# Altium footprint library TarabusLibrary.PcbLib: 591 footprints (part 15 of 37)
Each footprint in its own frame and in the unit in brackets; x right, y up, seen from the top. Pads: shape width x height; smd on the part's side, far side on the other; paste and mask are expansions set on the pad; w line width, h text height; cw(c..) or ccw(c..) is an arc to the next point about the centre after c.
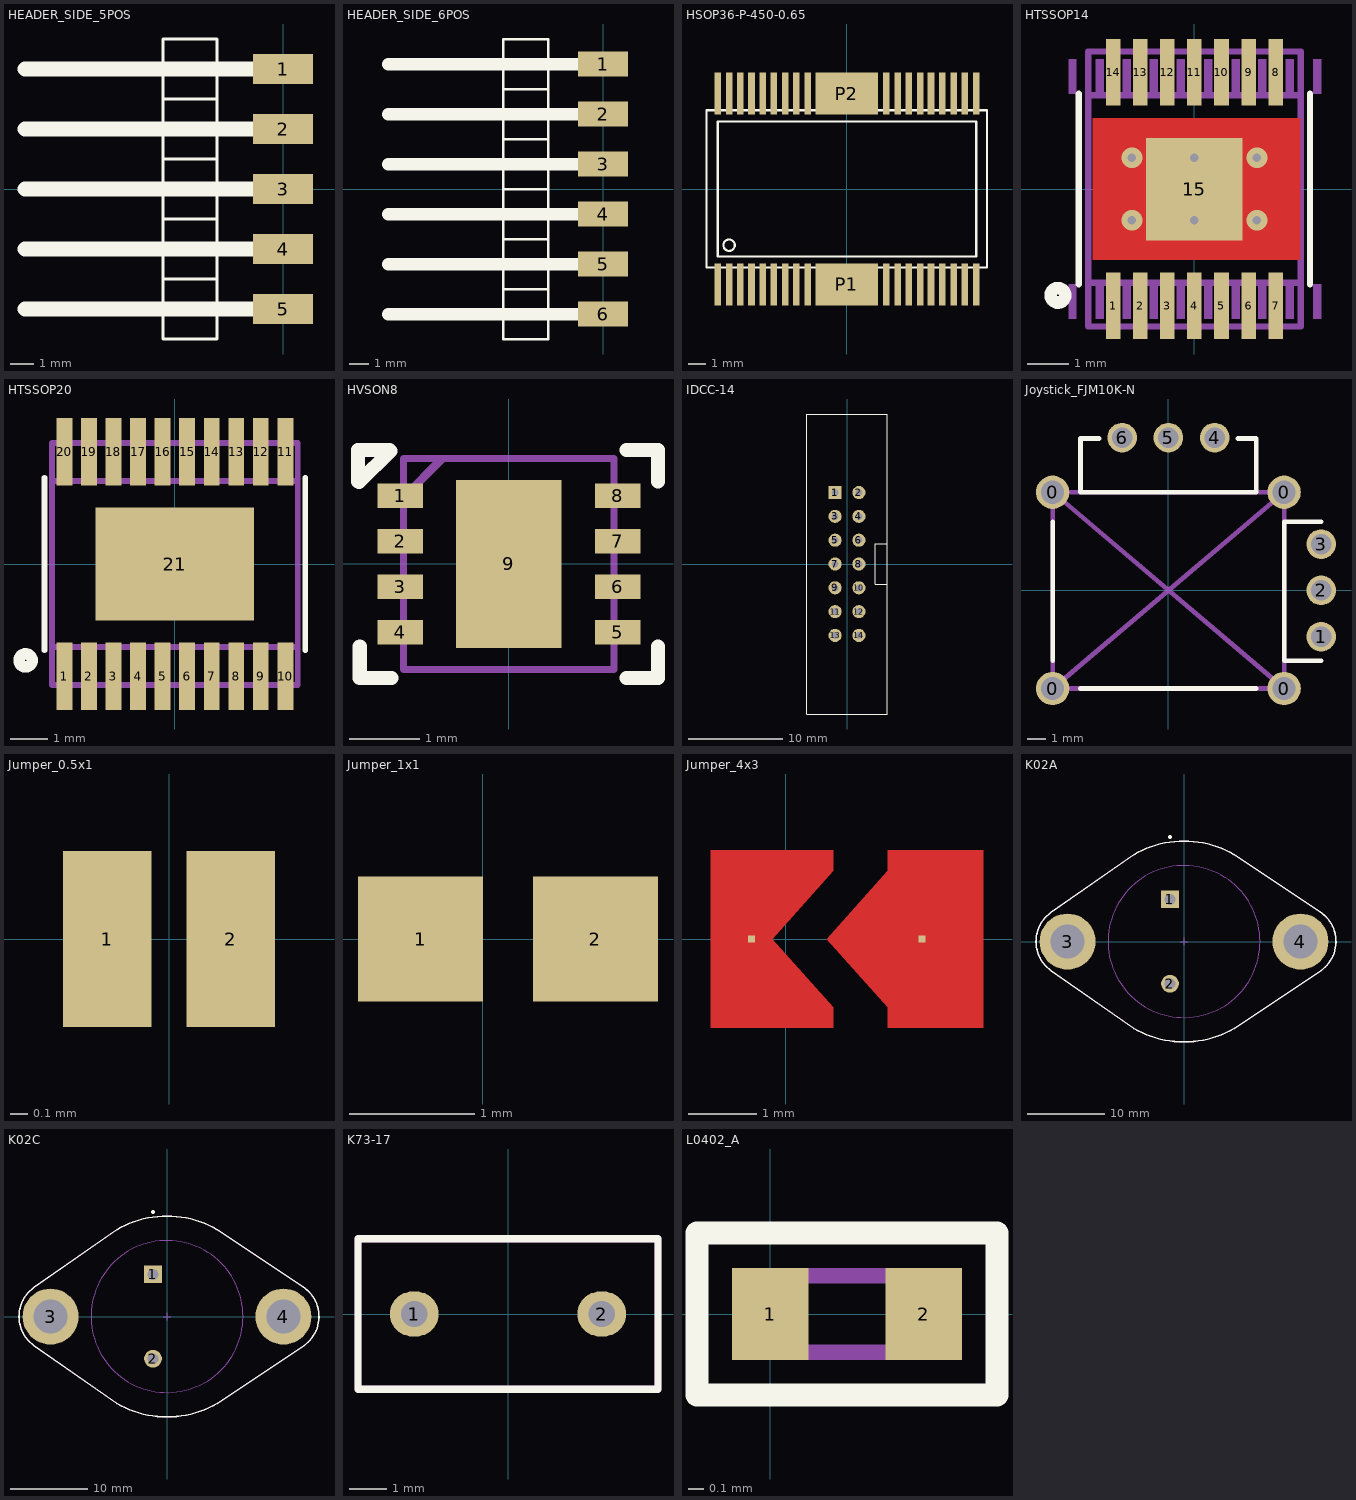
[diagram p14: the footprints below, top view; thin cyan lines are the x and y axes]

## HEADER_SIDE_5POS [mm]
pads (5):
  rect 2.54x1.27 smd: 1(0,5.08) 2(0,2.54) 3(0,0) 4(0,-2.54) 5(0,-5.08)
Top Overlay:
  lines w0.127: -2.794,-3.81 -5.08,-3.81 ; -2.794,-1.27 -5.08,-1.27 ; -5.08,-3.81 -5.08,-6.35 -2.794,-6.35 -2.794,1.27 ; -5.08,-3.81 -5.08,-1.27 ; -5.08,-1.27 -5.08,1.27 ; -5.08,1.27 -2.794,1.27 ; -5.08,1.27 -5.08,3.81 ; -5.08,3.81 -2.794,3.81 ; -5.08,3.81 -5.08,6.35 -2.794,6.35 -2.794,3.81 ; -2.794,1.27 -2.794,3.81
  lines w0.635: -10.922,-5.08 -0.508,-5.08 ; -10.922,-2.54 -0.508,-2.54 ; -10.922,0 -0.508,0 ; -10.922,2.54 -0.508,2.54 ; -10.922,5.08 -0.508,5.08

## HEADER_SIDE_6POS [mm]
pads (6):
  rect 2.54x1.27 smd: 1(0,6.35) 2(0,3.81) 3(0,1.27) 4(0,-1.27) 5(0,-3.81) 6(0,-6.35)
Top Overlay:
  lines w0.127: -5.08,-5.08 -5.08,-2.54 ; -5.08,-5.08 -5.08,-7.62 -2.794,-7.62 -2.794,-5.08 ; -5.08,-5.08 -2.794,-5.08 ; -5.08,-2.54 -5.08,0 ; -5.08,-2.54 -2.794,-2.54 ; -5.08,0 -5.08,2.54 ; -5.08,0 -2.794,0 ; -5.08,0 -2.794,0 ; -5.08,2.54 -5.08,5.08 ; -5.08,2.54 -2.794,2.54 ; -5.08,5.08 -5.08,7.62 -2.794,7.62 -2.794,5.08 ; -5.08,5.08 -2.794,5.08 ; -2.794,-5.08 -2.794,-2.54 ; -2.794,-2.54 -2.794,0 ; -2.794,0 -2.794,2.54 ; -2.794,2.54 -2.794,5.08
  lines w0.635: -10.922,-6.35 -0.508,-6.35 ; -10.922,-3.81 -0.508,-3.81 ; -10.922,-1.27 -0.508,-1.27 ; -10.922,1.27 -0.508,1.27 ; -10.922,3.81 -0.508,3.81 ; -10.922,6.35 -0.508,6.35

## HSOP36-P-450-0.65 [mil]
pads (38):
  rect 15x95 smd: 1(-294.29,-217.52) 2(-268.7,-217.52) 3(-243.11,-217.52) 4(-217.52,-217.52) 5(-191.93,-217.52) 6(-166.34,-217.52) 7(-140.75,-217.52) 8(-115.16,-217.52) 9(-89.57,-217.52) 10(90,-217.52) 11(116,-217.52) 12(141,-217.52) 13(167,-217.52) 14(192,-217.52) 15(218,-217.52) 16(244,-217.52) 17(269,-217.52) 18(295,-217.52) 19(295,218) 20(269,218) 21(244,218) 22(218,218) 23(192,218) 24(167,218) 25(141,218) 26(116,218) 27(90,218) 28(-89.57,218) 29(-115.16,218) 30(-140.75,218) 31(-166.34,218) 32(-191.93,218) 33(-217.52,218) 34(-243.11,218) 35(-268.7,218) 36(-294.29,218)
  rect 142x95 smd: P1(0,-217.52) P2(0,218)
Top Overlay:
  circle w5: c-268.7,-127.95 r13
  lines w5: -319.88,-179.13 320,-179.13 320,180 -319.88,180 -319.88,-179.13 ; -294.29,-153.54 295,-153.54 295,154 -294.29,154 -294.29,-153.54

## HTSSOP14 [mm]
height 1.1
pads (15):
  rect 0.35x1.6 smd mask+0.075: 1(-1.95,-2.8) 2(-1.3,-2.8) 3(-0.65,-2.8) 4(0,-2.8) 5(0.65,-2.8) 6(1.3,-2.8) 7(1.95,-2.8) 8(1.95,2.8) 9(1.3,2.8) 10(0.65,2.8) 11(0,2.8) 12(-0.65,2.8) 13(-1.3,2.8) 14(-1.95,2.8)
  rect 2.31x2.46 smd mask+0.075: 15(0,-0.002)
via 0,0.75 diameter 0.5 hole 0.2
via 0,-0.75 diameter 0.5 hole 0.2
via 1.5,-0.75 diameter 0.5 hole 0.2
via 1.5,0.75 diameter 0.5 hole 0.2
via -1.5,-0.75 diameter 0.5 hole 0.2
via -1.5,0.75 diameter 0.5 hole 0.2
Top Layer:
  rectangle: -2.45,-1.7 2.55,1.7
Top Overlay:
  circle w0.3: c-3.275,-2.552 r0.175
  lines w0.152: -2.775,-2.284 -2.775,2.284 ; 2.775,-2.284 2.775,2.284
Mechanical 7:
  lines w0.152: -2.55,-2.25 2.55,-2.25 ; -2.55,2.25 2.55,2.25 ; -2.55,-3.3 -2.55,3.3 2.55,3.3 2.55,-3.3 -2.55,-3.3
Mechanical 10:
  text ".Comment" at -1.7,4.45 h1.52
  text ".Designator" at -1.85,-5.225 h1.52
Mechanical 16:
  rectangle: -3.027,2.284 -2.823,3.123
  rectangle: -2.377,2.284 -2.173,3.123
  rectangle: -1.727,2.284 -1.523,3.123
  rectangle: -1.077,2.284 -0.873,3.123
  rectangle: -0.427,2.284 -0.223,3.123
  rectangle: 0.229,2.284 0.432,3.123
  rectangle: 0.889,2.284 1.092,3.123
  rectangle: 1.524,2.284 1.727,3.123
  rectangle: 2.184,2.284 2.388,3.123
  rectangle: 2.845,2.284 3.048,3.123
  rectangle: 2.845,-3.123 3.048,-2.284
  rectangle: 2.184,-3.123 2.388,-2.284
  rectangle: 1.524,-3.123 1.727,-2.284
  rectangle: 0.889,-3.123 1.092,-2.284
  rectangle: 0.229,-3.123 0.432,-2.284
  rectangle: -0.427,-3.123 -0.223,-2.284
  rectangle: -1.077,-3.123 -0.873,-2.284
  rectangle: -1.727,-3.123 -1.523,-2.284
  rectangle: -2.377,-3.123 -2.173,-2.284
  rectangle: -3.027,-3.123 -2.823,-2.284
3D body: height 1.1, standoff 0.05, extent -2.55,-2.25 2.55,2.25
3D body: height 0.5, standoff 0.05, extent -2.55,2.2 2.55,3.3
3D body: height 0.5, standoff 0.05, extent -2.55,-3.3 2.55,-2.2

## HTSSOP20 [mm]
height 1.1
pads (21):
  rect 0.42x1.78 smd mask+0.075: 1(-2.925,-2.97) 2(-2.275,-2.97) 3(-1.625,-2.97) 4(-0.975,-2.97) 5(-0.325,-2.97) 6(0.325,-2.97) 7(0.975,-2.97) 8(1.625,-2.97) 9(2.275,-2.97) 10(2.925,-2.97) 11(2.925,2.97) 12(2.275,2.97) 13(1.625,2.97) 14(0.975,2.97) 15(0.325,2.97) 16(-0.325,2.97) 17(-0.975,2.97) 18(-1.625,2.97) 19(-2.275,2.97) 20(-2.925,2.97)
  rect 4.2x3 smd mask+0.075: 21(0,-0.002)
Top Overlay:
  circle w0.3: c-3.95,-2.552 r0.175
  lines w0.152: -3.45,-2.284 -3.45,2.284 ; 3.45,-2.284 3.45,2.284
Mechanical 7:
  lines w0.152: -3.25,-2.2 3.25,-2.2 ; -3.25,2.2 3.25,2.2 ; -3.25,-3.2 3.25,-3.2 3.25,3.2 -3.25,3.2 -3.25,-3.2
Mechanical 10:
  text ".Designator" at -1.85,-5.225 h1.52
  text ".Comment" at -1.7,4.45 h1.52
Mechanical 16:
  rectangle: -3.027,-3.123 -2.823,-2.284
  rectangle: -2.377,-3.123 -2.173,-2.284
  rectangle: -1.727,-3.123 -1.523,-2.284
  rectangle: -1.077,-3.123 -0.873,-2.284
  rectangle: -0.427,-3.123 -0.223,-2.284
  rectangle: 0.229,-3.123 0.432,-2.284
  rectangle: 0.889,-3.123 1.092,-2.284
  rectangle: 1.524,-3.123 1.727,-2.284
  rectangle: 2.184,-3.123 2.388,-2.284
  rectangle: 2.845,-3.123 3.048,-2.284
  rectangle: 2.845,2.284 3.048,3.123
  rectangle: 2.184,2.284 2.388,3.123
  rectangle: 1.524,2.284 1.727,3.123
  rectangle: 0.889,2.284 1.092,3.123
  rectangle: 0.229,2.284 0.432,3.123
  rectangle: -0.427,2.284 -0.223,3.123
  rectangle: -1.077,2.284 -0.873,3.123
  rectangle: -1.727,2.284 -1.523,3.123
  rectangle: -2.377,2.284 -2.173,3.123
  rectangle: -3.027,2.284 -2.823,3.123
3D body: height 0.5, standoff 0.05, extent -3.25,-3.2 3.25,-2.2
3D body: height 0.5, standoff 0.05, extent -3.25,2.2 3.25,3.2
3D body: height 1.1, standoff 0.05, extent -3.25,-2.2 3.25,2.2

## HVSON8 [mm] "PSON, 8-Leads, Body 4x4mm, Pitch 0.8mm, NSC Recommended"
height 0.8
pads (9):
  rect 0.65x0.35 smd mask+0.051: 1(-1.55,0.975) 2(-1.55,0.325) 3(-1.55,-0.325) 4(-1.55,-0.975) 5(1.55,-0.975) 6(1.55,-0.325) 7(1.55,0.325) 8(1.55,0.975)
  rect 1.5x2.4 smd mask+0.051: 9(0,0)
Top Overlay:
  lines w0.2: -2.15,1.175 -2.15,1.625 -1.7,1.625 ; -2.134,1.166 -1.688,1.612 ; -2.125,-1.175 -2.125,-1.625 -1.675,-1.625 ; 1.675,-1.625 2.125,-1.625 2.125,-1.175 ; 1.675,1.625 2.125,1.625 2.125,1.175
Mechanical 7:
  lines w0.05: -1.5,0.9 -0.9,1.5 ; -1.475,0.975 -0.975,1.475 -1.025,1.475 -1.475,1.025 ; -1.5,-1.5 -1.5,1.5 1.5,1.5 1.5,-1.5 -1.5,-1.5
  lines w0.1: -0.5,0 0.5,0 ; 0,-0.5 0,0.5
Mechanical 9:
  lines w0.1: -1.5,-1.5 -1.5,1.5 1.5,1.5 1.5,-1.5 -1.5,-1.5
Mechanical 10:
  text ".Designator" at -1.175,-2 h0.6
  text ".Comment" at -1.025,1.775 h0.6
3D body: height 0.8, standoff 0, extent -1.5,-1.5 1.5,1.5

## IDCC-14 [mm]
pads (14):
  rect 1.4x1.4 hole 0.75: 1(-1.27,7.62)
  round 1.4 hole 0.75: 2(1.27,7.62) 3(-1.27,5.08) 4(1.27,5.08) 5(-1.27,2.54) 6(1.27,2.54) 7(-1.27,0) 8(1.27,0) 9(-1.27,-2.54) 10(1.27,-2.54) 11(-1.27,-5.08) 12(1.27,-5.08) 13(-1.27,-7.62) 14(1.27,-7.62)
Top Overlay:
  lines w0.1: 4.27,-2.15 3,-2.15 3,2.15 4.27,2.15 ; -4.27,-16 -4.27,16 4.27,16 4.27,-16 -4.27,-16
3D body: height 28, standoff 0, extent -4.27,10 4.27,16
3D body: height 28, standoff 0, extent -4.27,-16 4.27,-10
3D body: height 12, standoff 0, extent -4.27,-10 4.27,10

## Joystick_FJM10K-N [mm]
pads (10):
  round 1.8 hole 1.25: 0(-6.25,-5.311) 0(-6.25,5.289) 0(6.25,-5.311) 0(6.25,5.289)
  round 1.6 hole 1.1: 1(8.25,-2.511) 2(8.25,-0.011) 3(8.25,2.489) 4(2.5,8.239) 5(0,8.239) 6(-2.5,8.239)
Top Overlay:
  lines w0.254: -6.25,-3.811 -6.25,3.689 ; -4.75,-5.311 4.75,-5.311 ; -3.75,8.189 -4.75,8.189 -4.75,5.289 4.75,5.289 4.75,8.189 3.75,8.189 ; 8.25,-3.811 6.25,-3.811 6.25,3.689 8.25,3.689
Mechanical 7:
  lines w0.254: -6.225,5.289 6.25,-5.311 ; -6.25,-5.311 6.25,5.289 ; -6.25,-5.311 -6.25,5.289 6.25,5.289 ; -6.25,-5.311 6.25,-5.311 ; 6.25,-5.311 6.25,5.289
3D body "Основание джостика.STEP": height 18, standoff -3.7, extent -6.775,-6.536 10.275,10.264

## Jumper_0.5x1 [mm]
pads (2):
  rect 0.5x1 smd mask+0.1: 1(-0.35,0) 2(0.35,0)

## Jumper_1x1 [mm] "1x1"
pads (2):
  rect 1x1 smd mask+0.2: 1(-0.5,0) 2(0.9,0)

## Jumper_4x3 [mm] "4x3"
pads (2):
  rect 0.1x0.1 smd: 1(-0.5,0) 2(2,0)
Top Layer:
  region: 1.5,1.3 1.5,1 0.6,0 1.5,-1 1.5,-1.3 2.9,-1.3 2.9,1.3
  region: -1.1,1.3 -1.1,-1.3 0.7,-1.3 0.7,-1 -0.2,0 0.7,1 0.7,1.3
Top Solder:
  region: -1.3,1.5 -1.3,-1.5 3.1,-1.5 3.1,1.5

## K02A [mm] "Oval Flange Mount with (2) Offset Leads; Pin Spacing 10.93 mm; Lead Dia. 1.09 mm (max)"
height 8.94
pads (4):
  rect 2.3x2.3 hole 1.4: 1(-1.815,5.46)
  round 2.3 hole 1.4: 2(-1.815,-5.46)
  round 7.25 hole 4.4: 3(-15.075,0) 4(15.075,0)
Top Overlay:
  circle w0.25: c-1.815,13.53 r0.125
  lines w0.2: -17.2,-3.767 cw(c-14.561,0.001) -17.2,3.769 -6.5,11.258 cw(c0,0) 6.5,11.258 17.58,3.858 cw(c15.075,0) 17.713,-3.768 6.5,-11.258 cw(c0,0) -6.5,-11.258 -17.2,-3.767
Mechanical 13:
  circle w0.1: c0,0 r9.84
  lines w0.1: -17.2,-3.767 cw(c-14.561,0.001) -17.2,3.769 -6.5,11.258 cw(c0,0) 6.5,11.258 17.58,3.858 cw(c15.075,0) 17.713,-3.768 6.5,-11.258 cw(c0,0) -6.5,-11.258 -17.2,-3.767
Mechanical 15:
  lines w0.1: -0.5,0 0.5,0 ; 0,-0.5 0,0.5
3D body: height 1.77, standoff 0, extent -19.162,-13.001 19.676,13.001
3D body: height 8.94, standoff 1.77, extent -9.839,-9.839 9.839,9.839

## K02C [mm] "Oval Flange Mount with (2) Offset Leads; Pin Spacing 10.93 mm; Lead Dia. 1.09 mm (max)"
height 7.74
pads (4):
  rect 2.3x2.3 hole 1.4: 1(-1.815,5.46)
  round 2.3 hole 1.4: 2(-1.815,-5.46)
  round 7.25 hole 4.4: 3(-15.075,0) 4(15.075,0)
Top Overlay:
  circle w0.25: c-1.815,13.53 r0.125
  lines w0.2: -17.2,-3.767 cw(c-14.561,0.001) -17.2,3.769 -6.5,11.258 cw(c0,0) 6.5,11.258 17.58,3.858 cw(c15.075,0) 17.713,-3.768 6.5,-11.258 cw(c0,0) -6.5,-11.258 -17.2,-3.767
Mechanical 13:
  circle w0.1: c0,0 r9.84
  lines w0.1: -17.2,-3.767 cw(c-14.561,0.001) -17.2,3.769 -6.5,11.258 cw(c0,0) 6.5,11.258 17.58,3.858 cw(c15.075,0) 17.713,-3.768 6.5,-11.258 cw(c0,0) -6.5,-11.258 -17.2,-3.767
Mechanical 15:
  lines w0.1: -0.5,0 0.5,0 ; 0,-0.5 0,0.5
3D body: height 1.77, standoff 0, extent -19.162,-13.001 19.676,13.001
3D body: height 7.74, standoff 1.77, extent -9.839,-9.839 9.839,9.839

## K73-17 [mm]
pads (2):
  oval 1.3x1.2 hole 0.7: 1(-2.5,0) 2(2.5,0)
Top Overlay:
  lines w0.2: -4,-2 -4,2 4,2 4,-2 -4,-2
Mechanical 7:
  lines w0.2: -4,-2 4,-2 4,2 -4,2 -4,-2
Mechanical 10:
  text ".Designator" at 0.4,2.4 h0.8
  text ".Comment" at 1,-3 h0.6

## KD-7E [mm]

## L0402_A [mm]
pads (2):
  rect 0.5x0.6 smd: 1(0,0) 2(1,0)
Top Overlay:
  lines w0.15: -0.48,-0.53 -0.48,0.53 1.48,0.53 1.48,-0.53 -0.48,-0.53
Mechanical 7:
  lines w0.1: 0,-0.25 1,-0.25 1,0.25 0,0.25 0,-0.25
Mechanical 10:
  text ".Designator" at -0.08,0.75 h0.8
  text ".Comment" at -0.08,-1.11 h0.6
3D body: height 0.35, standoff 0, extent 0,-0.25 1,0.25